# Altium footprint library SPECIAL.PcbLib: 68 footprints (part 4 of 5)
Each footprint in its own frame and in the unit in brackets; x right, y up, seen from the top. Pads: shape width x height; smd on the part's side, far side on the other; paste and mask are expansions set on the pad; w line width, h text height; cw(c..) or ccw(c..) is an arc to the next point about the centre after c.
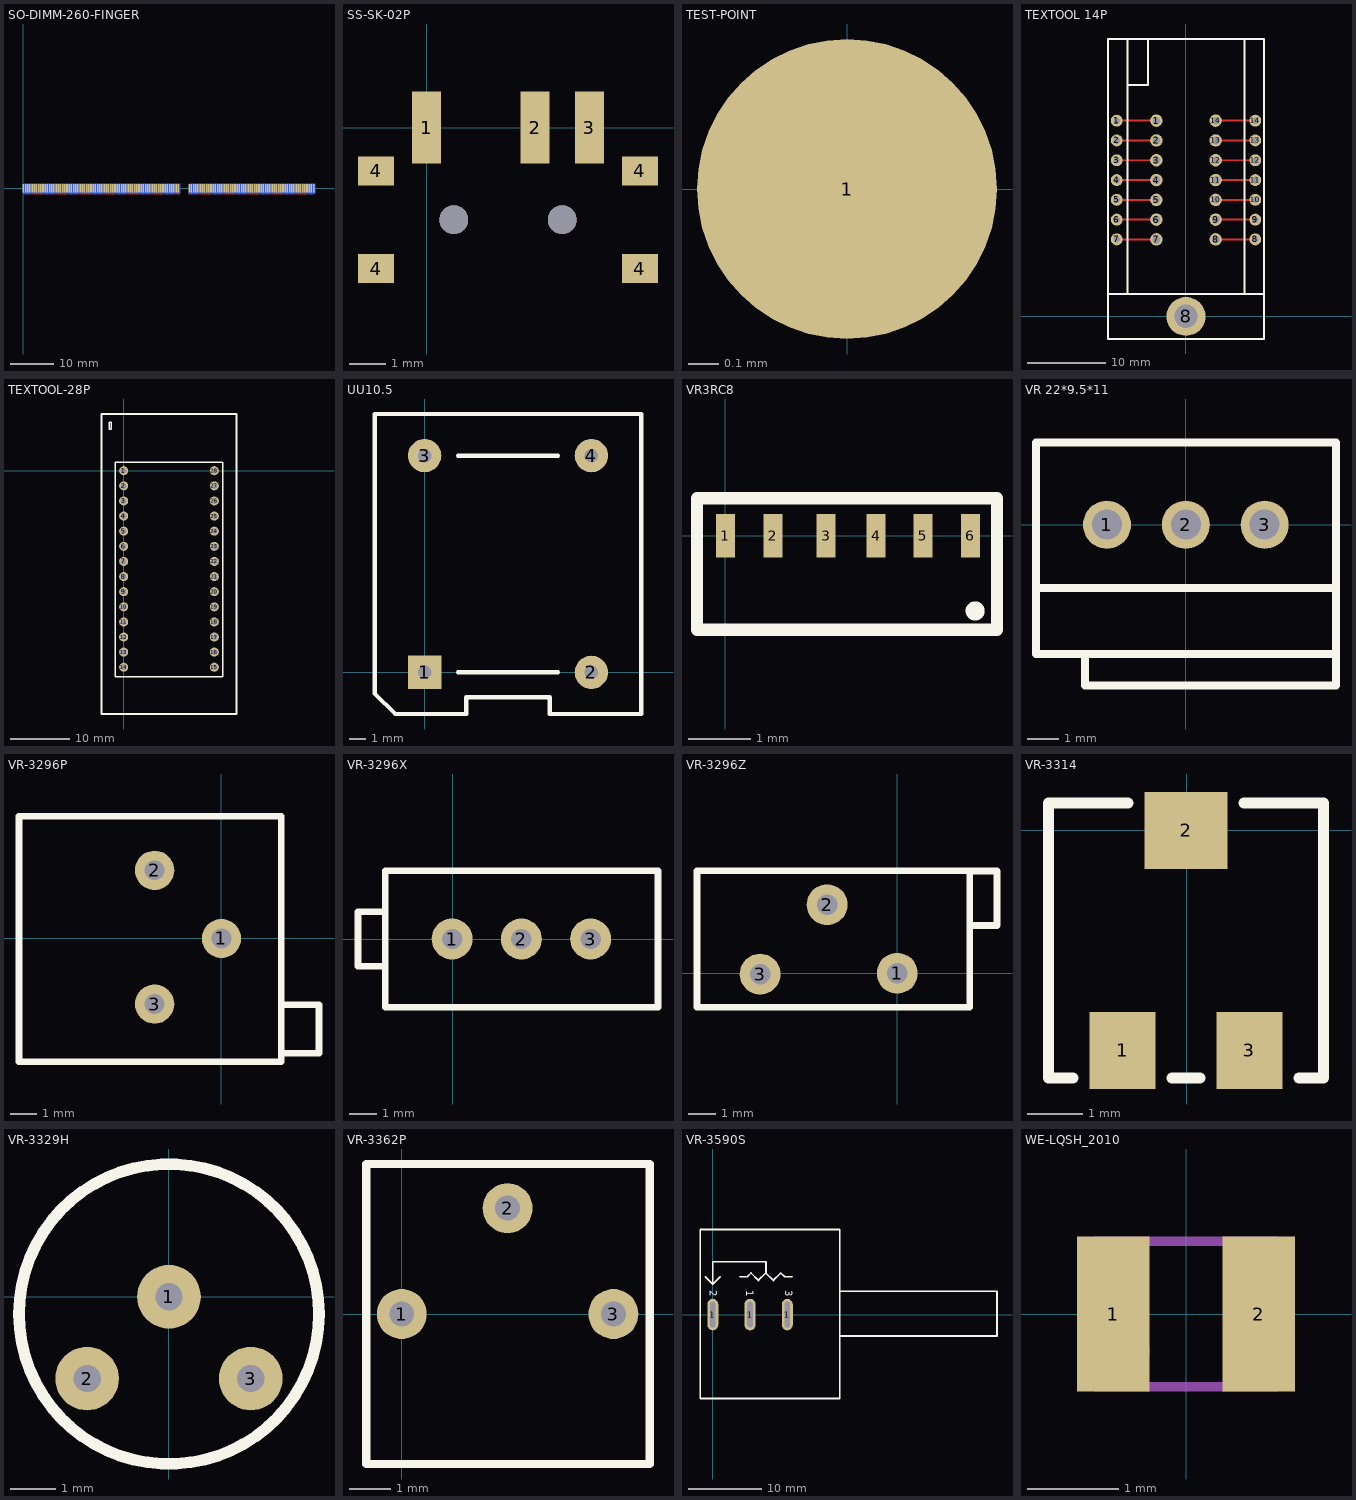
[diagram p3: the footprints below, top view; thin cyan lines are the x and y axes]

## SO-DIMM-260-FINGER [mm]
pads (260):
  rect 0.35x2 smd mask+0.102: 1(0,0) 2(0.5,0) 3(1,0) 4(1.5,0) 5(2,0) 6(2.5,0) 7(3,0) 8(3.5,0) 9(4,0) 10(4.5,0) 11(5,0) 12(5.5,0) 13(6,0) 14(6.5,0) 15(7,0) 16(7.5,0) 17(8,0) 18(8.5,0) 19(9,0) 20(9.5,0) 21(10,0) 22(10.5,0) 23(11,0) 24(11.5,0) 25(12,0) 26(12.5,0) 27(13,0) 28(13.5,0) 29(14,0) 30(14.5,0) 31(15,0) 32(15.5,0) 33(16,0) 34(16.5,0) 35(17,0) 36(17.5,0) 37(18,0) 38(18.5,0) 39(19,0) 40(19.5,0) 41(20,0) 42(20.5,0) 43(21,0) 44(21.5,0) 45(22,0) 46(22.5,0) 47(23,0) 48(23.5,0) 49(24,0) 50(24.5,0) 51(25,0) 52(25.5,0) 53(26,0) 54(26.5,0) 55(27,0) 56(27.5,0) 57(28,0) 58(28.5,0) 59(29,0) 60(29.5,0) 61(30,0) 62(30.5,0) 63(31,0) 64(31.5,0) 65(32,0) 66(32.5,0) 67(33,0) 68(33.5,0) 69(34,0) 70(34.5,0) 71(35,0) 72(35.5,0) 73(38,0) 74(38.5,0) 75(39,0) 76(39.5,0) 77(40,0) 78(40.5,0) 79(41,0) 80(41.5,0) 81(42,0) 82(42.5,0) 83(43,0) 84(43.5,0) 85(44,0) 86(44.5,0) 87(45,0) 88(45.5,0) 89(46,0) 90(46.5,0) 91(47,0) 92(47.5,0) 93(48,0) 94(48.5,0) 95(49,0) 96(49.5,0) 97(50,0) 98(50.5,0) 99(51,0) 100(51.5,0) 101(52,0) 102(52.5,0) 103(53,0) 104(53.5,0) 105(54,0) 106(54.5,0) 107(55,0) 108(55.5,0) 109(56,0) 110(56.5,0) 111(57,0) 112(57.5,0) 113(58,0) 114(58.5,0) 115(59,0) 116(59.5,0) 117(60,0) 118(60.5,0) 119(61,0) 120(61.5,0) 121(62,0) 122(62.5,0) 123(63,0) 124(63.5,0) 125(64,0) 126(64.5,0) 127(65,0) 128(65.5,0) 129(66,0) 130(66.5,0)
  rect 0.35x2 smd far side mask+0.102: 131(66.75,0) 132(66.25,0) 133(65.75,0) 134(65.25,0) 135(64.75,0) 136(64.25,0) 137(63.75,0) 138(63.25,0) 139(62.75,0) 140(62.25,0) 141(61.75,0) 142(61.25,0) 143(60.75,0) 144(60.25,0) 145(59.75,0) 146(59.25,0) 147(58.75,0) 148(58.25,0) 149(57.75,0) 150(57.25,0) 151(56.75,0) 152(56.25,0) 153(55.75,0) 154(55.25,0) 155(54.75,0) 156(54.25,0) 157(53.75,0) 158(53.25,0) 159(52.75,0) 160(52.25,0) 161(51.75,0) 162(51.25,0) 163(50.75,0) 164(50.25,0) 165(49.75,0) 166(49.25,0) 167(48.75,0) 168(48.25,0) 169(47.75,0) 170(47.25,0) 171(46.75,0) 172(46.25,0) 173(45.75,0) 174(45.25,0) 175(44.75,0) 176(44.25,0) 177(43.75,0) 178(43.25,0) 179(42.75,0) 180(42.25,0) 181(41.75,0) 182(41.25,0) 183(40.75,0) 184(40.25,0) 185(39.75,0) 186(39.25,0) 187(38.75,0) 188(38.25,0) 189(35.75,0) 190(35.25,0) 191(34.75,0) 192(34.25,0) 193(33.75,0) 194(33.25,0) 195(32.75,0) 196(32.25,0) 197(31.75,0) 198(31.25,0) 199(30.75,0) 200(30.25,0) 201(29.75,0) 202(29.25,0) 203(28.75,0) 204(28.25,0) 205(27.75,0) 206(27.25,0) 207(26.75,0) 208(26.25,0) 209(25.75,0) 210(25.25,0) 211(24.75,0) 212(24.25,0) 213(23.75,0) 214(23.25,0) 215(22.75,0) 216(22.25,0) 217(21.75,0) 218(21.25,0) 219(20.75,0) 220(20.25,0) 221(19.75,0) 222(19.25,0) 223(18.75,0) 224(18.25,0) 225(17.75,0) 226(17.25,0) 227(16.75,0) 228(16.25,0) 229(15.75,0) 230(15.25,0) 231(14.75,0) 232(14.25,0) 233(13.75,0) 234(13.25,0) 235(12.75,0) 236(12.25,0) 237(11.75,0) 238(11.25,0) 239(10.75,0) 240(10.25,0) 241(9.75,0) 242(9.25,0) 243(8.75,0) 244(8.25,0) 245(7.75,0) 246(7.25,0) 247(6.75,0) 248(6.25,0) 249(5.75,0) 250(5.25,0) 251(4.75,0) 252(4.25,0) 253(3.75,0) 254(3.25,0) 255(2.75,0) 256(2.25,0) 257(1.75,0) 258(1.25,0) 259(0.75,0) 260(0.25,0)
Top Layer:
  region: 37.825,-0.99 38.175,-0.99 38.175,-1.05 38.075,-1.15 38.075,-1.3 37.925,-1.3 37.925,-1.15 37.825,-1.05
  region: 38.325,-0.99 38.675,-0.99 38.675,-1.05 38.575,-1.15 38.575,-1.3 38.425,-1.3 38.425,-1.15 38.325,-1.05
  region: 38.825,-0.99 39.175,-0.99 39.175,-1.05 39.075,-1.15 39.075,-1.3 38.925,-1.3 38.925,-1.15 38.825,-1.05
  region: 39.325,-0.99 39.675,-0.99 39.675,-1.05 39.575,-1.15 39.575,-1.3 39.425,-1.3 39.425,-1.15 39.325,-1.05
  region: 39.825,-0.99 40.175,-0.99 40.175,-1.05 40.075,-1.15 40.075,-1.3 39.925,-1.3 39.925,-1.15 39.825,-1.05
  region: 40.325,-0.99 40.675,-0.99 40.675,-1.05 40.575,-1.15 40.575,-1.3 40.425,-1.3 40.425,-1.15 40.325,-1.05
  region: 40.825,-0.99 41.175,-0.99 41.175,-1.05 41.075,-1.15 41.075,-1.3 40.925,-1.3 40.925,-1.15 40.825,-1.05
  region: 41.325,-0.99 41.675,-0.99 41.675,-1.05 41.575,-1.15 41.575,-1.3 41.425,-1.3 41.425,-1.15 41.325,-1.05
  region: 41.825,-0.99 42.175,-0.99 42.175,-1.05 42.075,-1.15 42.075,-1.3 41.925,-1.3 41.925,-1.15 41.825,-1.05
  region: 42.325,-0.99 42.675,-0.99 42.675,-1.05 42.575,-1.15 42.575,-1.3 42.425,-1.3 42.425,-1.15 42.325,-1.05
  region: 42.825,-0.99 43.175,-0.99 43.175,-1.05 43.075,-1.15 43.075,-1.3 42.925,-1.3 42.925,-1.15 42.825,-1.05
  region: 43.325,-0.99 43.675,-0.99 43.675,-1.05 43.575,-1.15 43.575,-1.3 43.425,-1.3 43.425,-1.15 43.325,-1.05
  region: 43.825,-0.99 44.175,-0.99 44.175,-1.05 44.075,-1.15 44.075,-1.3 43.925,-1.3 43.925,-1.15 43.825,-1.05
  region: 44.325,-0.99 44.675,-0.99 44.675,-1.05 44.575,-1.15 44.575,-1.3 44.425,-1.3 44.425,-1.15 44.325,-1.05
  region: 44.825,-0.99 45.175,-0.99 45.175,-1.05 45.075,-1.15 45.075,-1.3 44.925,-1.3 44.925,-1.15 44.825,-1.05
  region: 45.325,-0.99 45.675,-0.99 45.675,-1.05 45.575,-1.15 45.575,-1.3 45.425,-1.3 45.425,-1.15 45.325,-1.05
  region: 45.825,-0.99 46.175,-0.99 46.175,-1.05 46.075,-1.15 46.075,-1.3 45.925,-1.3 45.925,-1.15 45.825,-1.05
  region: 46.325,-0.99 46.675,-0.99 46.675,-1.05 46.575,-1.15 46.575,-1.3 46.425,-1.3 46.425,-1.15 46.325,-1.05
  region: 46.825,-0.99 47.175,-0.99 47.175,-1.05 47.075,-1.15 47.075,-1.3 46.925,-1.3 46.925,-1.15 46.825,-1.05
  region: 47.325,-0.99 47.675,-0.99 47.675,-1.05 47.575,-1.15 47.575,-1.3 47.425,-1.3 47.425,-1.15 47.325,-1.05
  region: 47.825,-0.99 48.175,-0.99 48.175,-1.05 48.075,-1.15 48.075,-1.3 47.925,-1.3 47.925,-1.15 47.825,-1.05
  region: 48.325,-0.99 48.675,-0.99 48.675,-1.05 48.575,-1.15 48.575,-1.3 48.425,-1.3 48.425,-1.15 48.325,-1.05
  region: 48.825,-0.99 49.175,-0.99 49.175,-1.05 49.075,-1.15 49.075,-1.3 48.925,-1.3 48.925,-1.15 48.825,-1.05
  region: 49.325,-0.99 49.675,-0.99 49.675,-1.05 49.575,-1.15 49.575,-1.3 49.425,-1.3 49.425,-1.15 49.325,-1.05
  region: 49.825,-0.99 50.175,-0.99 50.175,-1.05 50.075,-1.15 50.075,-1.3 49.925,-1.3 49.925,-1.15 49.825,-1.05
  region: 50.325,-0.99 50.675,-0.99 50.675,-1.05 50.575,-1.15 50.575,-1.3 50.425,-1.3 50.425,-1.15 50.325,-1.05
  region: 50.825,-0.99 51.175,-0.99 51.175,-1.05 51.075,-1.15 51.075,-1.3 50.925,-1.3 50.925,-1.15 50.825,-1.05
  region: 51.325,-0.99 51.675,-0.99 51.675,-1.05 51.575,-1.15 51.575,-1.3 51.425,-1.3 51.425,-1.15 51.325,-1.05
  region: 51.825,-0.99 52.175,-0.99 52.175,-1.05 52.075,-1.15 52.075,-1.3 51.925,-1.3 51.925,-1.15 51.825,-1.05
  region: 52.325,-0.99 52.675,-0.99 52.675,-1.05 52.575,-1.15 52.575,-1.3 52.425,-1.3 52.425,-1.15 52.325,-1.05
  region: 52.825,-0.99 53.175,-0.99 53.175,-1.05 53.075,-1.15 53.075,-1.3 52.925,-1.3 52.925,-1.15 52.825,-1.05
  region: 53.325,-0.99 53.675,-0.99 53.675,-1.05 53.575,-1.15 53.575,-1.3 53.425,-1.3 53.425,-1.15 53.325,-1.05
  region: 53.825,-0.99 54.175,-0.99 54.175,-1.05 54.075,-1.15 54.075,-1.3 53.925,-1.3 53.925,-1.15 53.825,-1.05
  region: 54.325,-0.99 54.675,-0.99 54.675,-1.05 54.575,-1.15 54.575,-1.3 54.425,-1.3 54.425,-1.15 54.325,-1.05
  region: 54.825,-0.99 55.175,-0.99 55.175,-1.05 55.075,-1.15 55.075,-1.3 54.925,-1.3 54.925,-1.15 54.825,-1.05
  region: 55.325,-0.99 55.675,-0.99 55.675,-1.05 55.575,-1.15 55.575,-1.3 55.425,-1.3 55.425,-1.15 55.325,-1.05
  region: 55.825,-0.99 56.175,-0.99 56.175,-1.05 56.075,-1.15 56.075,-1.3 55.925,-1.3 55.925,-1.15 55.825,-1.05
  region: 56.325,-0.99 56.675,-0.99 56.675,-1.05 56.575,-1.15 56.575,-1.3 56.425,-1.3 56.425,-1.15 56.325,-1.05
  region: 56.825,-0.99 57.175,-0.99 57.175,-1.05 57.075,-1.15 57.075,-1.3 56.925,-1.3 56.925,-1.15 56.825,-1.05
  region: 57.325,-0.99 57.675,-0.99 57.675,-1.05 57.575,-1.15 57.575,-1.3 57.425,-1.3 57.425,-1.15 57.325,-1.05
  region: 57.825,-0.99 58.175,-0.99 58.175,-1.05 58.075,-1.15 58.075,-1.3 57.925,-1.3 57.925,-1.15 57.825,-1.05
  region: 58.325,-0.99 58.675,-0.99 58.675,-1.05 58.575,-1.15 58.575,-1.3 58.425,-1.3 58.425,-1.15 58.325,-1.05
  region: 58.825,-0.99 59.175,-0.99 59.175,-1.05 59.075,-1.15 59.075,-1.3 58.925,-1.3 58.925,-1.15 58.825,-1.05
  region: 59.325,-0.99 59.675,-0.99 59.675,-1.05 59.575,-1.15 59.575,-1.3 59.425,-1.3 59.425,-1.15 59.325,-1.05
  region: 59.825,-0.99 60.175,-0.99 60.175,-1.05 60.075,-1.15 60.075,-1.3 59.925,-1.3 59.925,-1.15 59.825,-1.05
  region: 60.325,-0.99 60.675,-0.99 60.675,-1.05 60.575,-1.15 60.575,-1.3 60.425,-1.3 60.425,-1.15 60.325,-1.05
  region: 60.825,-0.99 61.175,-0.99 61.175,-1.05 61.075,-1.15 61.075,-1.3 60.925,-1.3 60.925,-1.15 60.825,-1.05
  region: 61.325,-0.99 61.675,-0.99 61.675,-1.05 61.575,-1.15 61.575,-1.3 61.425,-1.3 61.425,-1.15 61.325,-1.05
  region: 61.825,-0.99 62.175,-0.99 62.175,-1.05 62.075,-1.15 62.075,-1.3 61.925,-1.3 61.925,-1.15 61.825,-1.05
  region: 62.325,-0.99 62.675,-0.99 62.675,-1.05 62.575,-1.15 62.575,-1.3 62.425,-1.3 62.425,-1.15 62.325,-1.05
  region: 62.825,-0.99 63.175,-0.99 63.175,-1.05 63.075,-1.15 63.075,-1.3 62.925,-1.3 62.925,-1.15 62.825,-1.05
  region: 63.325,-0.99 63.675,-0.99 63.675,-1.05 63.575,-1.15 63.575,-1.3 63.425,-1.3 63.425,-1.15 63.325,-1.05
  region: 63.825,-0.99 64.175,-0.99 64.175,-1.05 64.075,-1.15 64.075,-1.3 63.925,-1.3 63.925,-1.15 63.825,-1.05
  region: 64.325,-0.99 64.675,-0.99 64.675,-1.05 64.575,-1.15 64.575,-1.3 64.425,-1.3 64.425,-1.15 64.325,-1.05
  region: 64.825,-0.99 65.175,-0.99 65.175,-1.05 65.075,-1.15 65.075,-1.3 64.925,-1.3 64.925,-1.15 64.825,-1.05
  region: 65.325,-0.99 65.675,-0.99 65.675,-1.05 65.575,-1.15 65.575,-1.3 65.425,-1.3 65.425,-1.15 65.325,-1.05
  region: 65.825,-0.99 66.175,-0.99 66.175,-1.05 66.075,-1.15 66.075,-1.3 65.925,-1.3 65.925,-1.15 65.825,-1.05
  region: 66.325,-0.99 66.675,-0.99 66.675,-1.05 66.575,-1.15 66.575,-1.3 66.425,-1.3 66.425,-1.15 66.325,-1.05
  region: 34.325,-0.99 34.675,-0.99 34.675,-1.05 34.575,-1.15 34.575,-1.3 34.425,-1.3 34.425,-1.15 34.325,-1.05
  region: 32.325,-0.99 32.675,-0.99 32.675,-1.05 32.575,-1.15 32.575,-1.3 32.425,-1.3 32.425,-1.15 32.325,-1.05
  region: 30.325,-0.99 30.675,-0.99 30.675,-1.05 30.575,-1.15 30.575,-1.3 30.425,-1.3 30.425,-1.15 30.325,-1.05
  region: 28.325,-0.99 28.675,-0.99 28.675,-1.05 28.575,-1.15 28.575,-1.3 28.425,-1.3 28.425,-1.15 28.325,-1.05
  region: 26.325,-0.99 26.675,-0.99 26.675,-1.05 26.575,-1.15 26.575,-1.3 26.425,-1.3 26.425,-1.15 26.325,-1.05
  region: 24.325,-0.99 24.675,-0.99 24.675,-1.05 24.575,-1.15 24.575,-1.3 24.425,-1.3 24.425,-1.15 24.325,-1.05
  region: 22.325,-0.99 22.675,-0.99 22.675,-1.05 22.575,-1.15 22.575,-1.3 22.425,-1.3 22.425,-1.15 22.325,-1.05
  region: 9.825,-0.99 10.175,-0.99 10.175,-1.05 10.075,-1.15 10.075,-1.3 9.925,-1.3 9.925,-1.15 9.825,-1.05
  region: 7.825,-0.99 8.175,-0.99 8.175,-1.05 8.075,-1.15 8.075,-1.3 7.925,-1.3 7.925,-1.15 7.825,-1.05
  region: 5.825,-0.99 6.175,-0.99 6.175,-1.05 6.075,-1.15 6.075,-1.3 5.925,-1.3 5.925,-1.15 5.825,-1.05
  region: 3.825,-0.99 4.175,-0.99 4.175,-1.05 4.075,-1.15 4.075,-1.3 3.925,-1.3 3.925,-1.15 3.825,-1.05
  region: 1.825,-0.99 2.175,-0.99 2.175,-1.05 2.075,-1.15 2.075,-1.3 1.925,-1.3 1.925,-1.15 1.825,-1.05
  region: -0.175,-0.99 0.175,-0.99 0.175,-1.05 0.075,-1.15 0.075,-1.3 -0.075,-1.3 -0.075,-1.15 -0.175,-1.05
  region: 35.325,-0.99 35.675,-0.99 35.675,-1.05 35.575,-1.15 35.575,-1.3 35.425,-1.3 35.425,-1.15 35.325,-1.05
  region: 34.825,-0.99 35.175,-0.99 35.175,-1.05 35.075,-1.15 35.075,-1.3 34.925,-1.3 34.925,-1.15 34.825,-1.05
  region: 33.825,-0.99 34.175,-0.99 34.175,-1.05 34.075,-1.15 34.075,-1.3 33.925,-1.3 33.925,-1.15 33.825,-1.05
  region: 33.325,-0.99 33.675,-0.99 33.675,-1.05 33.575,-1.15 33.575,-1.3 33.425,-1.3 33.425,-1.15 33.325,-1.05
  region: 32.825,-0.99 33.175,-0.99 33.175,-1.05 33.075,-1.15 33.075,-1.3 32.925,-1.3 32.925,-1.15 32.825,-1.05
  region: 31.825,-0.99 32.175,-0.99 32.175,-1.05 32.075,-1.15 32.075,-1.3 31.925,-1.3 31.925,-1.15 31.825,-1.05
  region: 31.325,-0.99 31.675,-0.99 31.675,-1.05 31.575,-1.15 31.575,-1.3 31.425,-1.3 31.425,-1.15 31.325,-1.05
  region: 30.825,-0.99 31.175,-0.99 31.175,-1.05 31.075,-1.15 31.075,-1.3 30.925,-1.3 30.925,-1.15 30.825,-1.05
  region: 29.825,-0.99 30.175,-0.99 30.175,-1.05 30.075,-1.15 30.075,-1.3 29.925,-1.3 29.925,-1.15 29.825,-1.05
  region: 29.325,-0.99 29.675,-0.99 29.675,-1.05 29.575,-1.15 29.575,-1.3 29.425,-1.3 29.425,-1.15 29.325,-1.05
  region: 28.825,-0.99 29.175,-0.99 29.175,-1.05 29.075,-1.15 29.075,-1.3 28.925,-1.3 28.925,-1.15 28.825,-1.05
  region: 27.825,-0.99 28.175,-0.99 28.175,-1.05 28.075,-1.15 28.075,-1.3 27.925,-1.3 27.925,-1.15 27.825,-1.05
  region: 27.325,-0.99 27.675,-0.99 27.675,-1.05 27.575,-1.15 27.575,-1.3 27.425,-1.3 27.425,-1.15 27.325,-1.05
  region: 26.825,-0.99 27.175,-0.99 27.175,-1.05 27.075,-1.15 27.075,-1.3 26.925,-1.3 26.925,-1.15 26.825,-1.05
  region: 25.825,-0.99 26.175,-0.99 26.175,-1.05 26.075,-1.15 26.075,-1.3 25.925,-1.3 25.925,-1.15 25.825,-1.05
  region: 25.325,-0.99 25.675,-0.99 25.675,-1.05 25.575,-1.15 25.575,-1.3 25.425,-1.3 25.425,-1.15 25.325,-1.05
  region: 24.825,-0.99 25.175,-0.99 25.175,-1.05 25.075,-1.15 25.075,-1.3 24.925,-1.3 24.925,-1.15 24.825,-1.05
  region: 23.825,-0.99 24.175,-0.99 24.175,-1.05 24.075,-1.15 24.075,-1.3 23.925,-1.3 23.925,-1.15 23.825,-1.05
  region: 23.325,-0.99 23.675,-0.99 23.675,-1.05 23.575,-1.15 23.575,-1.3 23.425,-1.3 23.425,-1.15 23.325,-1.05
  region: 22.825,-0.99 23.175,-0.99 23.175,-1.05 23.075,-1.15 23.075,-1.3 22.925,-1.3 22.925,-1.15 22.825,-1.05
  region: 21.825,-0.99 22.175,-0.99 22.175,-1.05 22.075,-1.15 22.075,-1.3 21.925,-1.3 21.925,-1.15 21.825,-1.05
  region: 21.325,-0.99 21.675,-0.99 21.675,-1.05 21.575,-1.15 21.575,-1.3 21.425,-1.3 21.425,-1.15 21.325,-1.05
  region: 20.825,-0.99 21.175,-0.99 21.175,-1.05 21.075,-1.15 21.075,-1.3 20.925,-1.3 20.925,-1.15 20.825,-1.05
  region: 20.325,-0.99 20.675,-0.99 20.675,-1.05 20.575,-1.15 20.575,-1.3 20.425,-1.3 20.425,-1.15 20.325,-1.05
  region: 19.825,-0.99 20.175,-0.99 20.175,-1.05 20.075,-1.15 20.075,-1.3 19.925,-1.3 19.925,-1.15 19.825,-1.05
  region: 19.325,-0.99 19.675,-0.99 19.675,-1.05 19.575,-1.15 19.575,-1.3 19.425,-1.3 19.425,-1.15 19.325,-1.05
  region: 18.825,-0.99 19.175,-0.99 19.175,-1.05 19.075,-1.15 19.075,-1.3 18.925,-1.3 18.925,-1.15 18.825,-1.05
  region: 18.325,-0.99 18.675,-0.99 18.675,-1.05 18.575,-1.15 18.575,-1.3 18.425,-1.3 18.425,-1.15 18.325,-1.05
  region: 17.825,-0.99 18.175,-0.99 18.175,-1.05 18.075,-1.15 18.075,-1.3 17.925,-1.3 17.925,-1.15 17.825,-1.05
  region: 17.325,-0.99 17.675,-0.99 17.675,-1.05 17.575,-1.15 17.575,-1.3 17.425,-1.3 17.425,-1.15 17.325,-1.05
  region: 16.825,-0.99 17.175,-0.99 17.175,-1.05 17.075,-1.15 17.075,-1.3 16.925,-1.3 16.925,-1.15 16.825,-1.05
  region: 16.325,-0.99 16.675,-0.99 16.675,-1.05 16.575,-1.15 16.575,-1.3 16.425,-1.3 16.425,-1.15 16.325,-1.05
  region: 15.825,-0.99 16.175,-0.99 16.175,-1.05 16.075,-1.15 16.075,-1.3 15.925,-1.3 15.925,-1.15 15.825,-1.05
  region: 15.325,-0.99 15.675,-0.99 15.675,-1.05 15.575,-1.15 15.575,-1.3 15.425,-1.3 15.425,-1.15 15.325,-1.05
  region: 14.825,-0.99 15.175,-0.99 15.175,-1.05 15.075,-1.15 15.075,-1.3 14.925,-1.3 14.925,-1.15 14.825,-1.05
  region: 14.325,-0.99 14.675,-0.99 14.675,-1.05 14.575,-1.15 14.575,-1.3 14.425,-1.3 14.425,-1.15 14.325,-1.05
  region: 13.825,-0.99 14.175,-0.99 14.175,-1.05 14.075,-1.15 14.075,-1.3 13.925,-1.3 13.925,-1.15 13.825,-1.05
  region: 13.325,-0.99 13.675,-0.99 13.675,-1.05 13.575,-1.15 13.575,-1.3 13.425,-1.3 13.425,-1.15 13.325,-1.05
  region: 12.825,-0.99 13.175,-0.99 13.175,-1.05 13.075,-1.15 13.075,-1.3 12.925,-1.3 12.925,-1.15 12.825,-1.05
  region: 12.325,-0.99 12.675,-0.99 12.675,-1.05 12.575,-1.15 12.575,-1.3 12.425,-1.3 12.425,-1.15 12.325,-1.05
  region: 11.825,-0.99 12.175,-0.99 12.175,-1.05 12.075,-1.15 12.075,-1.3 11.925,-1.3 11.925,-1.15 11.825,-1.05
  region: 11.325,-0.99 11.675,-0.99 11.675,-1.05 11.575,-1.15 11.575,-1.3 11.425,-1.3 11.425,-1.15 11.325,-1.05
  region: 10.825,-0.99 11.175,-0.99 11.175,-1.05 11.075,-1.15 11.075,-1.3 10.925,-1.3 10.925,-1.15 10.825,-1.05
  region: 10.325,-0.99 10.675,-0.99 10.675,-1.05 10.575,-1.15 10.575,-1.3 10.425,-1.3 10.425,-1.15 10.325,-1.05
  region: 9.325,-0.99 9.675,-0.99 9.675,-1.05 9.575,-1.15 9.575,-1.3 9.425,-1.3 9.425,-1.15 9.325,-1.05
  region: 8.825,-0.99 9.175,-0.99 9.175,-1.05 9.075,-1.15 9.075,-1.3 8.925,-1.3 8.925,-1.15 8.825,-1.05
  region: 8.325,-0.99 8.675,-0.99 8.675,-1.05 8.575,-1.15 8.575,-1.3 8.425,-1.3 8.425,-1.15 8.325,-1.05
  region: 7.325,-0.99 7.675,-0.99 7.675,-1.05 7.575,-1.15 7.575,-1.3 7.425,-1.3 7.425,-1.15 7.325,-1.05
  region: 6.825,-0.99 7.175,-0.99 7.175,-1.05 7.075,-1.15 7.075,-1.3 6.925,-1.3 6.925,-1.15 6.825,-1.05
  region: 6.325,-0.99 6.675,-0.99 6.675,-1.05 6.575,-1.15 6.575,-1.3 6.425,-1.3 6.425,-1.15 6.325,-1.05
  region: 5.325,-0.99 5.675,-0.99 5.675,-1.05 5.575,-1.15 5.575,-1.3 5.425,-1.3 5.425,-1.15 5.325,-1.05
  region: 4.825,-0.99 5.175,-0.99 5.175,-1.05 5.075,-1.15 5.075,-1.3 4.925,-1.3 4.925,-1.15 4.825,-1.05
  region: 4.325,-0.99 4.675,-0.99 4.675,-1.05 4.575,-1.15 4.575,-1.3 4.425,-1.3 4.425,-1.15 4.325,-1.05
  region: 3.325,-0.99 3.675,-0.99 3.675,-1.05 3.575,-1.15 3.575,-1.3 3.425,-1.3 3.425,-1.15 3.325,-1.05
  region: 2.825,-0.99 3.175,-0.99 3.175,-1.05 3.075,-1.15 3.075,-1.3 2.925,-1.3 2.925,-1.15 2.825,-1.05
  region: 2.325,-0.99 2.675,-0.99 2.675,-1.05 2.575,-1.15 2.575,-1.3 2.425,-1.3 2.425,-1.15 2.325,-1.05
  region: 1.325,-0.99 1.675,-0.99 1.675,-1.05 1.575,-1.15 1.575,-1.3 1.425,-1.3 1.425,-1.15 1.325,-1.05
  region: 0.825,-0.99 1.175,-0.99 1.175,-1.05 1.075,-1.15 1.075,-1.3 0.925,-1.3 0.925,-1.15 0.825,-1.05
  region: 0.325,-0.99 0.675,-0.99 0.675,-1.05 0.575,-1.15 0.575,-1.3 0.425,-1.3 0.425,-1.15 0.325,-1.05
Bottom Layer:
  region: 66.575,-0.99 66.925,-0.99 66.925,-1.05 66.825,-1.15 66.825,-1.3 66.675,-1.3 66.675,-1.15 66.575,-1.05
  region: 66.075,-0.99 66.425,-0.99 66.425,-1.05 66.325,-1.15 66.325,-1.3 66.175,-1.3 66.175,-1.15 66.075,-1.05
  region: 65.575,-0.99 65.925,-0.99 65.925,-1.05 65.825,-1.15 65.825,-1.3 65.675,-1.3 65.675,-1.15 65.575,-1.05
  region: 65.075,-0.99 65.425,-0.99 65.425,-1.05 65.325,-1.15 65.325,-1.3 65.175,-1.3 65.175,-1.15 65.075,-1.05
  region: 64.575,-0.99 64.925,-0.99 64.925,-1.05 64.825,-1.15 64.825,-1.3 64.675,-1.3 64.675,-1.15 64.575,-1.05
  region: 64.075,-0.99 64.425,-0.99 64.425,-1.05 64.325,-1.15 64.325,-1.3 64.175,-1.3 64.175,-1.15 64.075,-1.05
  region: 63.575,-0.99 63.925,-0.99 63.925,-1.05 63.825,-1.15 63.825,-1.3 63.675,-1.3 63.675,-1.15 63.575,-1.05
  region: 63.075,-0.99 63.425,-0.99 63.425,-1.05 63.325,-1.15 63.325,-1.3 63.175,-1.3 63.175,-1.15 63.075,-1.05
  region: 62.575,-0.99 62.925,-0.99 62.925,-1.05 62.825,-1.15 62.825,-1.3 62.675,-1.3 62.675,-1.15 62.575,-1.05
  region: 62.075,-0.99 62.425,-0.99 62.425,-1.05 62.325,-1.15 62.325,-1.3 62.175,-1.3 62.175,-1.15 62.075,-1.05
  region: 61.575,-0.99 61.925,-0.99 61.925,-1.05 61.825,-1.15 61.825,-1.3 61.675,-1.3 61.675,-1.15 61.575,-1.05
  region: 61.075,-0.99 61.425,-0.99 61.425,-1.05 61.325,-1.15 61.325,-1.3 61.175,-1.3 61.175,-1.15 61.075,-1.05
  region: 60.575,-0.99 60.925,-0.99 60.925,-1.05 60.825,-1.15 60.825,-1.3 60.675,-1.3 60.675,-1.15 60.575,-1.05
  region: 60.075,-0.99 60.425,-0.99 60.425,-1.05 60.325,-1.15 60.325,-1.3 60.175,-1.3 60.175,-1.15 60.075,-1.05
  region: 59.575,-0.99 59.925,-0.99 59.925,-1.05 59.825,-1.15 59.825,-1.3 59.675,-1.3 59.675,-1.15 59.575,-1.05
  region: 59.075,-0.99 59.425,-0.99 59.425,-1.05 59.325,-1.15 59.325,-1.3 59.175,-1.3 59.175,-1.15 59.075,-1.05
  region: 58.575,-0.99 58.925,-0.99 58.925,-1.05 58.825,-1.15 58.825,-1.3 58.675,-1.3 58.675,-1.15 58.575,-1.05
  region: 58.075,-0.99 58.425,-0.99 58.425,-1.05 58.325,-1.15 58.325,-1.3 58.175,-1.3 58.175,-1.15 58.075,-1.05
  region: 57.575,-0.99 57.925,-0.99 57.925,-1.05 57.825,-1.15 57.825,-1.3 57.675,-1.3 57.675,-1.15 57.575,-1.05
  region: 57.075,-0.99 57.425,-0.99 57.425,-1.05 57.325,-1.15 57.325,-1.3 57.175,-1.3 57.175,-1.15 57.075,-1.05
  region: 56.575,-0.99 56.925,-0.99 56.925,-1.05 56.825,-1.15 56.825,-1.3 56.675,-1.3 56.675,-1.15 56.575,-1.05
  region: 56.075,-0.99 56.425,-0.99 56.425,-1.05 56.325,-1.15 56.325,-1.3 56.175,-1.3 56.175,-1.15 56.075,-1.05
  region: 55.575,-0.99 55.925,-0.99 55.925,-1.05 55.825,-1.15 55.825,-1.3 55.675,-1.3 55.675,-1.15 55.575,-1.05
  region: 55.075,-0.99 55.425,-0.99 55.425,-1.05 55.325,-1.15 55.325,-1.3 55.175,-1.3 55.175,-1.15 55.075,-1.05
  region: 54.575,-0.99 54.925,-0.99 54.925,-1.05 54.825,-1.15 54.825,-1.3 54.675,-1.3 54.675,-1.15 54.575,-1.05
  region: 54.075,-0.99 54.425,-0.99 54.425,-1.05 54.325,-1.15 54.325,-1.3 54.175,-1.3 54.175,-1.15 54.075,-1.05
  region: 53.575,-0.99 53.925,-0.99 53.925,-1.05 53.825,-1.15 53.825,-1.3 53.675,-1.3 53.675,-1.15 53.575,-1.05
  region: 53.075,-0.99 53.425,-0.99 53.425,-1.05 53.325,-1.15 53.325,-1.3 53.175,-1.3 53.175,-1.15 53.075,-1.05
  region: 52.575,-0.99 52.925,-0.99 52.925,-1.05 52.825,-1.15 52.825,-1.3 52.675,-1.3 52.675,-1.15 52.575,-1.05
  region: 52.075,-0.99 52.425,-0.99 52.425,-1.05 52.325,-1.15 52.325,-1.3 52.175,-1.3 52.175,-1.15 52.075,-1.05
  region: 51.575,-0.99 51.925,-0.99 51.925,-1.05 51.825,-1.15 51.825,-1.3 51.675,-1.3 51.675,-1.15 51.575,-1.05
  region: 51.075,-0.99 51.425,-0.99 51.425,-1.05 51.325,-1.15 51.325,-1.3 51.175,-1.3 51.175,-1.15 51.075,-1.05
  region: 50.575,-0.99 50.925,-0.99 50.925,-1.05 50.825,-1.15 50.825,-1.3 50.675,-1.3 50.675,-1.15 50.575,-1.05
  region: 50.075,-0.99 50.425,-0.99 50.425,-1.05 50.325,-1.15 50.325,-1.3 50.175,-1.3 50.175,-1.15 50.075,-1.05
  region: 49.575,-0.99 49.925,-0.99 49.925,-1.05 49.825,-1.15 49.825,-1.3 49.675,-1.3 49.675,-1.15 49.575,-1.05
  region: 49.075,-0.99 49.425,-0.99 49.425,-1.05 49.325,-1.15 49.325,-1.3 49.175,-1.3 49.175,-1.15 49.075,-1.05
  region: 48.575,-0.99 48.925,-0.99 48.925,-1.05 48.825,-1.15 48.825,-1.3 48.675,-1.3 48.675,-1.15 48.575,-1.05
  region: 48.075,-0.99 48.425,-0.99 48.425,-1.05 48.325,-1.15 48.325,-1.3 48.175,-1.3 48.175,-1.15 48.075,-1.05
  region: 47.575,-0.99 47.925,-0.99 47.925,-1.05 47.825,-1.15 47.825,-1.3 47.675,-1.3 47.675,-1.15 47.575,-1.05
  region: 47.075,-0.99 47.425,-0.99 47.425,-1.05 47.325,-1.15 47.325,-1.3 47.175,-1.3 47.175,-1.15 47.075,-1.05
  region: 46.575,-0.99 46.925,-0.99 46.925,-1.05 46.825,-1.15 46.825,-1.3 46.675,-1.3 46.675,-1.15 46.575,-1.05
  region: 46.075,-0.99 46.425,-0.99 46.425,-1.05 46.325,-1.15 46.325,-1.3 46.175,-1.3 46.175,-1.15 46.075,-1.05
  region: 45.575,-0.99 45.925,-0.99 45.925,-1.05 45.825,-1.15 45.825,-1.3 45.675,-1.3 45.675,-1.15 45.575,-1.05
  region: 45.075,-0.99 45.425,-0.99 45.425,-1.05 45.325,-1.15 45.325,-1.3 45.175,-1.3 45.175,-1.15 45.075,-1.05
  region: 44.575,-0.99 44.925,-0.99 44.925,-1.05 44.825,-1.15 44.825,-1.3 44.675,-1.3 44.675,-1.15 44.575,-1.05
  region: 44.075,-0.99 44.425,-0.99 44.425,-1.05 44.325,-1.15 44.325,-1.3 44.175,-1.3 44.175,-1.15 44.075,-1.05
  region: 43.575,-0.99 43.925,-0.99 43.925,-1.05 43.825,-1.15 43.825,-1.3 43.675,-1.3 43.675,-1.15 43.575,-1.05
  region: 43.075,-0.99 43.425,-0.99 43.425,-1.05 43.325,-1.15 43.325,-1.3 43.175,-1.3 43.175,-1.15 43.075,-1.05
  region: 42.575,-0.99 42.925,-0.99 42.925,-1.05 42.825,-1.15 42.825,-1.3 42.675,-1.3 42.675,-1.15 42.575,-1.05
  region: 42.075,-0.99 42.425,-0.99 42.425,-1.05 42.325,-1.15 42.325,-1.3 42.175,-1.3 42.175,-1.15 42.075,-1.05
  region: 41.575,-0.99 41.925,-0.99 41.925,-1.05 41.825,-1.15 41.825,-1.3 41.675,-1.3 41.675,-1.15 41.575,-1.05
  region: 41.075,-0.99 41.425,-0.99 41.425,-1.05 41.325,-1.15 41.325,-1.3 41.175,-1.3 41.175,-1.15 41.075,-1.05
  region: 40.575,-0.99 40.925,-0.99 40.925,-1.05 40.825,-1.15 40.825,-1.3 40.675,-1.3 40.675,-1.15 40.575,-1.05
  region: 40.075,-0.99 40.425,-0.99 40.425,-1.05 40.325,-1.15 40.325,-1.3 40.175,-1.3 40.175,-1.15 40.075,-1.05
  region: 39.575,-0.99 39.925,-0.99 39.925,-1.05 39.825,-1.15 39.825,-1.3 39.675,-1.3 39.675,-1.15 39.575,-1.05
  region: 39.075,-0.99 39.425,-0.99 39.425,-1.05 39.325,-1.15 39.325,-1.3 39.175,-1.3 39.175,-1.15 39.075,-1.05
  region: 38.575,-0.99 38.925,-0.99 38.925,-1.05 38.825,-1.15 38.825,-1.3 38.675,-1.3 38.675,-1.15 38.575,-1.05
  region: 38.075,-0.99 38.425,-0.99 38.425,-1.05 38.325,-1.15 38.325,-1.3 38.175,-1.3 38.175,-1.15 38.075,-1.05
  region: 35.575,-0.99 35.925,-0.99 35.925,-1.05 35.825,-1.15 35.825,-1.3 35.675,-1.3 35.675,-1.15 35.575,-1.05
  region: 35.075,-0.99 35.425,-0.99 35.425,-1.05 35.325,-1.15 35.325,-1.3 35.175,-1.3 35.175,-1.15 35.075,-1.05
  region: 34.575,-0.99 34.925,-0.99 34.925,-1.05 34.825,-1.15 34.825,-1.3 34.675,-1.3 34.675,-1.15 34.575,-1.05
  region: 34.075,-0.99 34.425,-0.99 34.425,-1.05 34.325,-1.15 34.325,-1.3 34.175,-1.3 34.175,-1.15 34.075,-1.05
  region: 33.575,-0.99 33.925,-0.99 33.925,-1.05 33.825,-1.15 33.825,-1.3 33.675,-1.3 33.675,-1.15 33.575,-1.05
  region: 33.075,-0.99 33.425,-0.99 33.425,-1.05 33.325,-1.15 33.325,-1.3 33.175,-1.3 33.175,-1.15 33.075,-1.05
  region: 32.575,-0.99 32.925,-0.99 32.925,-1.05 32.825,-1.15 32.825,-1.3 32.675,-1.3 32.675,-1.15 32.575,-1.05
  region: 32.075,-0.99 32.425,-0.99 32.425,-1.05 32.325,-1.15 32.325,-1.3 32.175,-1.3 32.175,-1.15 32.075,-1.05
  region: 31.575,-0.99 31.925,-0.99 31.925,-1.05 31.825,-1.15 31.825,-1.3 31.675,-1.3 31.675,-1.15 31.575,-1.05
  region: 31.075,-0.99 31.425,-0.99 31.425,-1.05 31.325,-1.15 31.325,-1.3 31.175,-1.3 31.175,-1.15 31.075,-1.05
  region: 30.575,-0.99 30.925,-0.99 30.925,-1.05 30.825,-1.15 30.825,-1.3 30.675,-1.3 30.675,-1.15 30.575,-1.05
  region: 30.075,-0.99 30.425,-0.99 30.425,-1.05 30.325,-1.15 30.325,-1.3 30.175,-1.3 30.175,-1.15 30.075,-1.05
  region: 29.575,-0.99 29.925,-0.99 29.925,-1.05 29.825,-1.15 29.825,-1.3 29.675,-1.3 29.675,-1.15 29.575,-1.05
  region: 29.075,-0.99 29.425,-0.99 29.425,-1.05 29.325,-1.15 29.325,-1.3 29.175,-1.3 29.175,-1.15 29.075,-1.05
  region: 28.575,-0.99 28.925,-0.99 28.925,-1.05 28.825,-1.15 28.825,-1.3 28.675,-1.3 28.675,-1.15 28.575,-1.05
  region: 28.075,-0.99 28.425,-0.99 28.425,-1.05 28.325,-1.15 28.325,-1.3 28.175,-1.3 28.175,-1.15 28.075,-1.05
  region: 27.575,-0.99 27.925,-0.99 27.925,-1.05 27.825,-1.15 27.825,-1.3 27.675,-1.3 27.675,-1.15 27.575,-1.05
  region: 27.075,-0.99 27.425,-0.99 27.425,-1.05 27.325,-1.15 27.325,-1.3 27.175,-1.3 27.175,-1.15 27.075,-1.05
  region: 26.575,-0.99 26.925,-0.99 26.925,-1.05 26.825,-1.15 26.825,-1.3 26.675,-1.3 26.675,-1.15 26.575,-1.05
  region: 26.075,-0.99 26.425,-0.99 26.425,-1.05 26.325,-1.15 26.325,-1.3 26.175,-1.3 26.175,-1.15 26.075,-1.05
  region: 25.575,-0.99 25.925,-0.99 25.925,-1.05 25.825,-1.15 25.825,-1.3 25.675,-1.3 25.675,-1.15 25.575,-1.05
  region: 25.075,-0.99 25.425,-0.99 25.425,-1.05 25.325,-1.15 25.325,-1.3 25.175,-1.3 25.175,-1.15 25.075,-1.05
  region: 24.575,-0.99 24.925,-0.99 24.925,-1.05 24.825,-1.15 24.825,-1.3 24.675,-1.3 24.675,-1.15 24.575,-1.05
  region: 24.075,-0.99 24.425,-0.99 24.425,-1.05 24.325,-1.15 24.325,-1.3 24.175,-1.3 24.175,-1.15 24.075,-1.05
  region: 23.575,-0.99 23.925,-0.99 23.925,-1.05 23.825,-1.15 23.825,-1.3 23.675,-1.3 23.675,-1.15 23.575,-1.05
  region: 23.075,-0.99 23.425,-0.99 23.425,-1.05 23.325,-1.15 23.325,-1.3 23.175,-1.3 23.175,-1.15 23.075,-1.05
  region: 22.575,-0.99 22.925,-0.99 22.925,-1.05 22.825,-1.15 22.825,-1.3 22.675,-1.3 22.675,-1.15 22.575,-1.05
  region: 22.075,-0.99 22.425,-0.99 22.425,-1.05 22.325,-1.15 22.325,-1.3 22.175,-1.3 22.175,-1.15 22.075,-1.05
  region: 21.575,-0.99 21.925,-0.99 21.925,-1.05 21.825,-1.15 21.825,-1.3 21.675,-1.3 21.675,-1.15 21.575,-1.05
  region: 21.075,-0.99 21.425,-0.99 21.425,-1.05 21.325,-1.15 21.325,-1.3 21.175,-1.3 21.175,-1.15 21.075,-1.05
  region: 20.575,-0.99 20.925,-0.99 20.925,-1.05 20.825,-1.15 20.825,-1.3 20.675,-1.3 20.675,-1.15 20.575,-1.05
  region: 20.075,-0.99 20.425,-0.99 20.425,-1.05 20.325,-1.15 20.325,-1.3 20.175,-1.3 20.175,-1.15 20.075,-1.05
  region: 19.575,-0.99 19.925,-0.99 19.925,-1.05 19.825,-1.15 19.825,-1.3 19.675,-1.3 19.675,-1.15 19.575,-1.05
  region: 19.075,-0.99 19.425,-0.99 19.425,-1.05 19.325,-1.15 19.325,-1.3 19.175,-1.3 19.175,-1.15 19.075,-1.05
  region: 18.575,-0.99 18.925,-0.99 18.925,-1.05 18.825,-1.15 18.825,-1.3 18.675,-1.3 18.675,-1.15 18.575,-1.05
  region: 18.075,-0.99 18.425,-0.99 18.425,-1.05 18.325,-1.15 18.325,-1.3 18.175,-1.3 18.175,-1.15 18.075,-1.05
  region: 17.575,-0.99 17.925,-0.99 17.925,-1.05 17.825,-1.15 17.825,-1.3 17.675,-1.3 17.675,-1.15 17.575,-1.05
  region: 17.075,-0.99 17.425,-0.99 17.425,-1.05 17.325,-1.15 17.325,-1.3 17.175,-1.3 17.175,-1.15 17.075,-1.05
  region: 16.575,-0.99 16.925,-0.99 16.925,-1.05 16.825,-1.15 16.825,-1.3 16.675,-1.3 16.675,-1.15 16.575,-1.05
  region: 16.075,-0.99 16.425,-0.99 16.425,-1.05 16.325,-1.15 16.325,-1.3 16.175,-1.3 16.175,-1.15 16.075,-1.05
  region: 15.575,-0.99 15.925,-0.99 15.925,-1.05 15.825,-1.15 15.825,-1.3 15.675,-1.3 15.675,-1.15 15.575,-1.05
  region: 15.075,-0.99 15.425,-0.99 15.425,-1.05 15.325,-1.15 15.325,-1.3 15.175,-1.3 15.175,-1.15 15.075,-1.05
  region: 14.575,-0.99 14.925,-0.99 14.925,-1.05 14.825,-1.15 14.825,-1.3 14.675,-1.3 14.675,-1.15 14.575,-1.05
  region: 14.075,-0.99 14.425,-0.99 14.425,-1.05 14.325,-1.15 14.325,-1.3 14.175,-1.3 14.175,-1.15 14.075,-1.05
  region: 13.575,-0.99 13.925,-0.99 13.925,-1.05 13.825,-1.15 13.825,-1.3 13.675,-1.3 13.675,-1.15 13.575,-1.05
  region: 13.075,-0.99 13.425,-0.99 13.425,-1.05 13.325,-1.15 13.325,-1.3 13.175,-1.3 13.175,-1.15 13.075,-1.05
  region: 12.575,-0.99 12.925,-0.99 12.925,-1.05 12.825,-1.15 12.825,-1.3 12.675,-1.3 12.675,-1.15 12.575,-1.05
  region: 12.075,-0.99 12.425,-0.99 12.425,-1.05 12.325,-1.15 12.325,-1.3 12.175,-1.3 12.175,-1.15 12.075,-1.05
  region: 11.575,-0.99 11.925,-0.99 11.925,-1.05 11.825,-1.15 11.825,-1.3 11.675,-1.3 11.675,-1.15 11.575,-1.05
  region: 11.075,-0.99 11.425,-0.99 11.425,-1.05 11.325,-1.15 11.325,-1.3 11.175,-1.3 11.175,-1.15 11.075,-1.05
  region: 10.575,-0.99 10.925,-0.99 10.925,-1.05 10.825,-1.15 10.825,-1.3 10.675,-1.3 10.675,-1.15 10.575,-1.05
  region: 10.075,-0.99 10.425,-0.99 10.425,-1.05 10.325,-1.15 10.325,-1.3 10.175,-1.3 10.175,-1.15 10.075,-1.05
  region: 9.575,-0.99 9.925,-0.99 9.925,-1.05 9.825,-1.15 9.825,-1.3 9.675,-1.3 9.675,-1.15 9.575,-1.05
  region: 9.075,-0.99 9.425,-0.99 9.425,-1.05 9.325,-1.15 9.325,-1.3 9.175,-1.3 9.175,-1.15 9.075,-1.05
  region: 8.575,-0.99 8.925,-0.99 8.925,-1.05 8.825,-1.15 8.825,-1.3 8.675,-1.3 8.675,-1.15 8.575,-1.05
  region: 8.075,-0.99 8.425,-0.99 8.425,-1.05 8.325,-1.15 8.325,-1.3 8.175,-1.3 8.175,-1.15 8.075,-1.05
  region: 7.575,-0.99 7.925,-0.99 7.925,-1.05 7.825,-1.15 7.825,-1.3 7.675,-1.3 7.675,-1.15 7.575,-1.05
  region: 7.075,-0.99 7.425,-0.99 7.425,-1.05 7.325,-1.15 7.325,-1.3 7.175,-1.3 7.175,-1.15 7.075,-1.05
  region: 6.575,-0.99 6.925,-0.99 6.925,-1.05 6.825,-1.15 6.825,-1.3 6.675,-1.3 6.675,-1.15 6.575,-1.05
  region: 6.075,-0.99 6.425,-0.99 6.425,-1.05 6.325,-1.15 6.325,-1.3 6.175,-1.3 6.175,-1.15 6.075,-1.05
  region: 5.575,-0.99 5.925,-0.99 5.925,-1.05 5.825,-1.15 5.825,-1.3 5.675,-1.3 5.675,-1.15 5.575,-1.05
  region: 5.075,-0.99 5.425,-0.99 5.425,-1.05 5.325,-1.15 5.325,-1.3 5.175,-1.3 5.175,-1.15 5.075,-1.05
  region: 4.575,-0.99 4.925,-0.99 4.925,-1.05 4.825,-1.15 4.825,-1.3 4.675,-1.3 4.675,-1.15 4.575,-1.05
  region: 4.075,-0.99 4.425,-0.99 4.425,-1.05 4.325,-1.15 4.325,-1.3 4.175,-1.3 4.175,-1.15 4.075,-1.05
  region: 3.575,-0.99 3.925,-0.99 3.925,-1.05 3.825,-1.15 3.825,-1.3 3.675,-1.3 3.675,-1.15 3.575,-1.05
  region: 3.075,-0.99 3.425,-0.99 3.425,-1.05 3.325,-1.15 3.325,-1.3 3.175,-1.3 3.175,-1.15 3.075,-1.05
  region: 2.575,-0.99 2.925,-0.99 2.925,-1.05 2.825,-1.15 2.825,-1.3 2.675,-1.3 2.675,-1.15 2.575,-1.05
  region: 2.075,-0.99 2.425,-0.99 2.425,-1.05 2.325,-1.15 2.325,-1.3 2.175,-1.3 2.175,-1.15 2.075,-1.05
  region: 1.575,-0.99 1.925,-0.99 1.925,-1.05 1.825,-1.15 1.825,-1.3 1.675,-1.3 1.675,-1.15 1.575,-1.05
  region: 1.075,-0.99 1.425,-0.99 1.425,-1.05 1.325,-1.15 1.325,-1.3 1.175,-1.3 1.175,-1.15 1.075,-1.05
  region: 0.575,-0.99 0.925,-0.99 0.925,-1.05 0.825,-1.15 0.825,-1.3 0.675,-1.3 0.675,-1.15 0.575,-1.05
  region: 0.075,-0.99 0.425,-0.99 0.425,-1.05 0.325,-1.15 0.325,-1.3 0.175,-1.3 0.175,-1.15 0.075,-1.05
Top Solder:
  rectangle: -0.25,-1.3 35.75,1
  rectangle: 37.75,-1.3 66.75,1
Bottom Solder:
  rectangle: 38,-1.3 67,1
  rectangle: 0,-1.3 36,1

## SS-SK-02P [mm]
pads (9):
  rect 0.8x2 smd: 1(0,0) 2(3,0) 3(4.5,0)
  rect 1x0.8 smd: 4(-1.4,-3.9) 4(-1.4,-1.2) 4(5.9,-3.9) 4(5.9,-1.2)
  round 0.8 hole 0.8 paste-999 mask+0.102: ""(0.75,-2.55) ""(3.75,-2.55)

## TEST-POINT [mm]
pads (1):
  round 1 smd mask+0.01: 1(0,0)

## TEXTOOL 14P [mm]
pads (29):
  round 1.524 hole 0.85: 1(-8.889,25.118) 2(-8.889,22.578) 3(-8.889,20.038) 4(-8.889,17.498) 5(-8.889,14.958) 6(-8.889,12.418) 7(-8.889,9.878) 8(8.891,9.878) 9(8.891,12.418) 10(8.891,14.958) 11(8.891,17.498) 12(8.891,20.038) 13(8.891,22.578) 14(8.891,25.118)
  round 1.6 hole 1: 1(-3.809,25.118) 2(-3.809,22.578) 3(-3.809,20.038) 4(-3.809,17.498) 5(-3.809,14.958) 6(-3.809,12.418) 7(-3.809,9.878) 8(3.811,9.878) 9(3.811,12.418) 10(3.811,14.958) 11(3.811,17.498) 12(3.811,20.038) 13(3.811,22.578) 14(3.811,25.118)
  round 5 hole 3: 8(0.001,-0.002)
Top Layer:
  lines w0.254: -8.889,9.878 -3.809,9.878 ; -8.889,12.418 -3.809,12.418 ; -8.889,14.958 -3.809,14.958 ; -8.889,17.498 -3.809,17.498 ; -8.889,20.038 -3.809,20.038 ; -8.889,22.578 -3.809,22.578 ; -8.889,25.118 -3.809,25.118 ; 3.811,9.878 8.891,9.878 ; 3.811,12.418 8.891,12.418 ; 3.811,14.958 8.891,14.958 ; 3.811,17.498 8.891,17.498 ; 3.811,20.038 8.891,20.038 ; 3.811,22.578 8.891,22.578 ; 3.811,25.118 8.891,25.118
Top Overlay:
  lines w0.254: -9.999,-2.902 -9.999,2.878 ; -9.989,-2.902 10.001,-2.902 10.001,-2.542 10.001,2.878 ; -7.379,29.708 -4.879,29.708 -4.879,35.598 ; 7.511,35.598 10.001,35.598 10.001,2.878 ; -9.999,2.878 -7.499,2.878 ; -9.999,2.878 -9.999,35.598 -7.499,35.598 ; -7.499,2.878 7.501,2.878 ; -7.499,2.878 -7.499,35.598 ; -7.499,35.598 7.501,35.598 7.501,2.878 ; 7.501,2.878 10.001,2.878

## TEXTOOL-28P [mil]
pads (28):
  round 60 hole 39.37: 1(-0.06,0) 2(-0.06,-100) 3(-0.06,-200) 4(-0.06,-300) 5(-0.06,-400) 6(-0.06,-500) 7(-0.06,-600) 8(-0.06,-700) 9(-0.06,-800) 10(-0.06,-900) 11(-0.06,-1000) 12(-0.06,-1100) 13(-0.06,-1199.6) 14(-0.06,-1299.6) 15(599.94,-1299.6) 16(599.94,-1199.6) 17(599.94,-1100) 18(599.94,-1000) 19(599.94,-900) 20(599.94,-800) 21(599.94,-700) 22(599.94,-600) 23(599.94,-500) 24(599.94,-400) 25(599.94,-300) 26(599.94,-200) 27(599.94,-100) 28(599.94,0)
Top Overlay:
  lines w10: -96.51,321.66 -96.51,273.23 -84.7,273.23 -83.52,274.41 -83.52,320.48 -84.7,321.66 -95.33,321.66 ; 648.37,-1363.38 -54.39,-1363.38 -54.39,54.73 648.37,54.73 ; 654.28,-1363.38 654.28,54.73 ; -146.51,-1609.05 746.4,-1609.05 746.4,375.2 -146.51,375.2 -146.51,-1609.05

## UU10.5 [mm] "AC 隔離線圈"
height 21
pads (4):
  rect 2x2 hole 0.8: 1(0,0)
  round 2 hole 0.8: 2(10,0) 3(0,13) 4(10,13)
Top Overlay:
  lines w0.25: 2.5,-2.5 -1.76,-2.5 -3,-1.26 -3,15.5 13,15.5 13,-2.5 7.5,-2.5
  lines w0.254: 2,0 8,0 ; 2,13 8,13 ; 2.5,-2.5 2.5,-1.5 7.49,-1.5 ; 7.5,-2.5 7.5,-1.5

## VR3RC8 [mm]
height 0.8
pads (6):
  rect 0.3x0.7 smd: 1(0,0) 2(0.76,0) 3(1.61,0) 4(2.41,0) 5(3.16,0) 6(3.92,0)
Top Overlay:
  circle w0.254: c3.995,-1.2 r0.025
  lines w0.2: -0.455,0.575 -0.455,-1.5 4.345,-1.5 4.345,0.575 ; -0.455,0.6 0.795,0.6 3.195,0.6 4.345,0.6

## VR 22*9.5*11 [mil]
pads (3):
  round 60 hole 37.4: 1(-98.43,0) 2(0,0) 3(98.43,0)
Top Overlay:
  lines w10: -187.01,-78.74 187.01,-78.74 ; -125.59,-161.81 -125.59,-200.39 187.4,-200.39 187.4,102.36 186.61,102.36 ; 187.01,-161.42 -187.01,-161.42 -187.01,102.36 187.01,102.36

## VR-3296P [mm]
pads (3):
  round 1.5 hole 0.75: 1(0,0) 2(-2.55,2.6) 3(-2.55,-2.5)
Top Overlay:
  lines w0.25: 2.281,-4.698 -7.719,-4.698 -7.719,4.666 2.281,4.666 ; 2.281,-4.382 2.281,-2.53 3.718,-2.53 3.718,-4.382 2.281,-4.382
  lines w0.254: 2.279,-4.705 2.279,-4.303 ; 2.28,-3.026 2.28,4.663
3D body "User Library-3296P.STEP": height 5.4, standoff -1.5, extent -7.762,-4.744 3.788,4.786

## VR-3296X [mm]
pads (3):
  round 1.5 hole 0.75: 1(-0.018,0.018) 2(2.522,0.018) 3(5.062,0.018)
Top Overlay:
  lines w0.25: -2.468,-0.982 -3.468,-0.982 -3.468,1.018 -2.468,1.018 ; -2.468,-2.482 -2.468,2.518 7.532,2.518 7.532,-2.482 -2.468,-2.482
3D body "User Library-3296X.STEP": height 10.03, standoff -1.6, extent -3.721,-2.388 7.309,2.412

## VR-3296Z [mm]
pads (3):
  round 1.5 hole 0.75: 1(-0.001,0) 2(-2.573,2.514) 3(-5.027,-0.031)
Top Overlay:
  lines w0.25: 2.658,1.749 3.658,1.749 3.658,3.749 2.658,3.749 ; -7.342,-1.243 -7.342,3.757 2.658,3.757 2.658,-1.243 -7.342,-1.243
3D body "User Library-3296Z.STEP": height 10.03, standoff -1.6, extent -7.327,-1.138 3.703,3.662

## VR-3314 [mm]
pads (3):
  rect 1.2x1.4 smd: 1(-1.168,-4) 3(1.132,-4)
  rect 1.5x1.4 smd: 2(-0.018,0)
Top Overlay:
  lines w0.2: -2.068,-4.5 -2.518,-4.5 -2.518,0.5 -1.068,0.5 ; -0.268,-4.5 0.232,-4.5 ; 1.032,0.5 2.482,0.5 2.482,-4.5 2.032,-4.5
3D body "User Library-3314j-1-502e.STEP": height 2.77, standoff 0.04, extent -2.507,-4.5 2.492,0.504

## VR-3329H [mm]
pads (3):
  round 1.4 hole 0.6: 1(0,0) 2(-1.8,-1.8) 3(1.8,-1.8)
Top Overlay:
  circle w0.254: c0.001,-0.379 r3.3
3D body "User Library-3329H.STEP": height 4.57, standoff -1.5, extent -3.166,-3.513 3.184,2.837

## VR-3362P [mm]
height 4.7
pads (3):
  round 1.2 hole 0.6: 1(0,0) 2(2.54,2.54) 3(5.08,0)
Top Overlay:
  lines w0.2: -0.85,-3.6 -0.85,3.6 5.95,3.6 5.95,-3.6 -0.85,-3.6
3D body "Bourns 3362P.STEP": height 4.7, standoff -5.47, extent -0.76,-3.754 5.84,3.3

## VR-3590S [mm]
pads (3):
  oval 1.5x4.3 hole 0.7 slot 3.5 at 90 deg: 1(0.001,0.001) 1(5.075,0.001) 1(10.15,0.001)
Top Overlay:
  lines w0.25: -1.015,5.161 0.001,4.145 ; 1.017,5.161 0.001,4.145 ; 3.684,5.161 4.7,5.161 5.208,5.669 6.224,4.653 7.24,5.669 ; 5.843,7.193 7.24,7.193 7.24,5.669 ; 6.097,7.193 0.001,7.193 0.001,4.145 ; 10.796,5.161 9.78,5.161 9.272,5.669 8.256,4.653 7.24,5.669 ; 17.3,-2.919 38.732,-2.919 38.732,3.17 17.3,3.17 ; -1.699,-11.419 17.3,-11.419 17.3,11.581 -1.699,11.581 -1.699,-11.419
  text "2" at -0.38,3.351 h1
  text "3" at 9.907,3.351 h1
  text "1" at 4.573,3.351 h1
3D body "User Library-Bourns 3590S-2-502L.STEP": height 23.3, standoff -3.53, extent -1.887,-11.088 38.513,11.513

## WE-LQSH_2010 [mm] "SMT Semi-Shielded High Saturation Power Inductor, body 2x1.6mm"
height 1
pads (2):
  rect 0.8x1.7 smd: 1(-0.8,0) 2(0.8,0)
Mechanical 13:
  circle w0.2: c-0.6,-0.4 r0.1
  lines w0.1: -1,-0.8 -1,0.8 1,0.8 1,-0.8 -1,-0.8
3D body "IndLQSH_2010.stp": height 0.99, standoff -0.01, extent -1,-0.8 1,0.8